# Altium footprint library adafruit.PCBLIB: 648 footprints (part 34 of 41)
Each footprint in its own frame and in the unit in brackets; x right, y up, seen from the top. Pads: shape width x height; smd on the part's side, far side on the other; paste and mask are expansions set on the pad; w line width, h text height; cw(c..) or ccw(c..) is an arc to the next point about the centre after c.
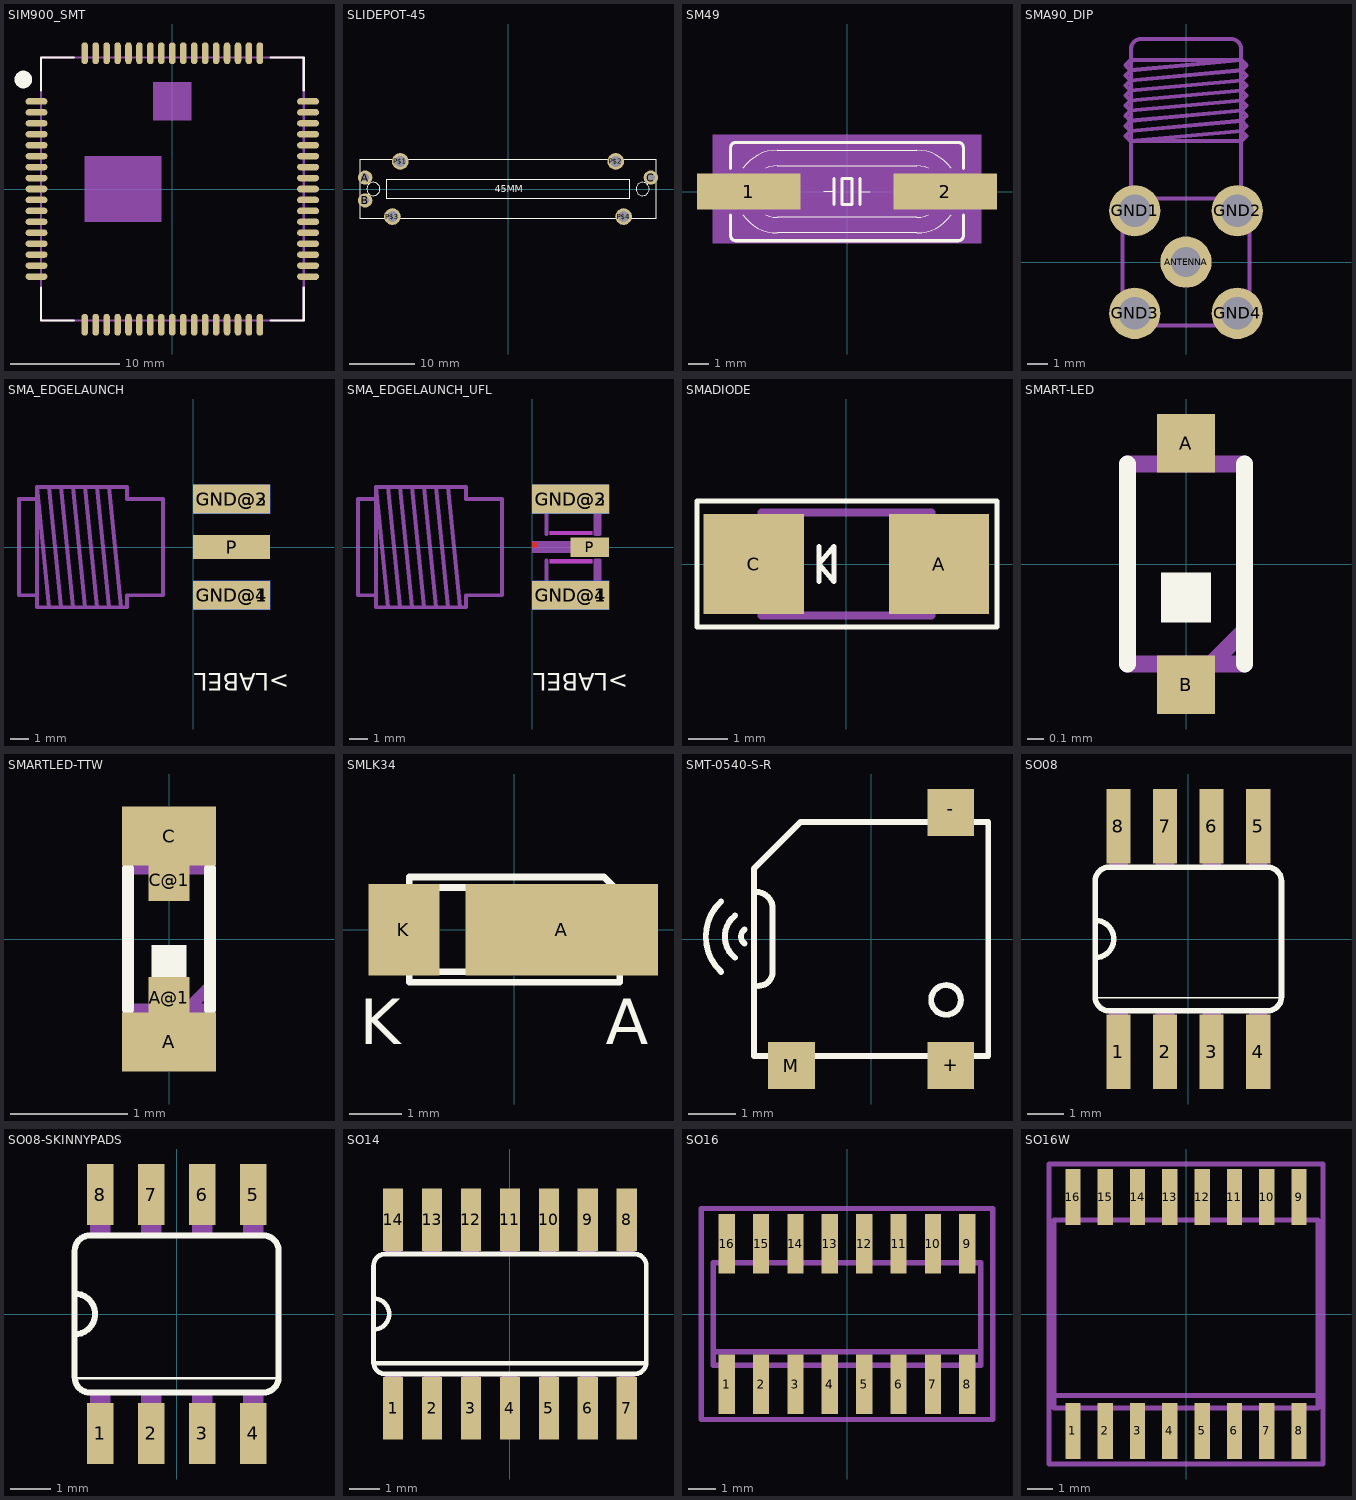
[diagram p33: the footprints below, top view; thin cyan lines are the x and y axes]

## SIM900_SMT [mm]
pads (68):
  rrect100% 2x0.6 smd: P$1(-12.4,8) P$2(-12.4,7) P$3(-12.4,6) P$4(-12.4,5) P$5(-12.4,4) P$6(-12.4,3) P$7(-12.4,2) P$8(-12.4,1) P$9(-12.4,0) P$10(-12.4,-1) P$11(-12.4,-2) P$12(-12.4,-3) P$13(-12.4,-4) P$14(-12.4,-5) P$15(-12.4,-6) P$16(-12.4,-7) P$17(-12.4,-8) P$35(12.4,-8) P$36(12.4,-7) P$37(12.4,-6) P$38(12.4,-5) P$39(12.4,-4) P$40(12.4,-3) P$41(12.4,-2) P$42(12.4,-1) P$43(12.4,0) P$44(12.4,1) P$45(12.4,2) P$46(12.4,3) P$47(12.4,4) P$48(12.4,5) P$49(12.4,6) P$50(12.4,7) P$51(12.4,8)
  rrect100% 0.6x2 smd: P$18(-8,-12.4) P$19(-7,-12.4) P$20(-6,-12.4) P$21(-5,-12.4) P$22(-4,-12.4) P$23(-3,-12.4) P$24(-2,-12.4) P$25(-1,-12.4) P$26(0,-12.4) P$27(1,-12.4) P$28(2,-12.4) P$29(3,-12.4) P$30(4,-12.4) P$31(5,-12.4) P$32(6,-12.4) P$33(7,-12.4) P$34(8,-12.4) P$52(8,12.4) P$53(7,12.4) P$54(6,12.4) P$55(5,12.4) P$56(4,12.4) P$57(3,12.4) P$58(2,12.4) P$59(1,12.4) P$60(0,12.4) P$61(-1,12.4) P$62(-2,12.4) P$63(-3,12.4) P$64(-4,12.4) P$65(-5,12.4) P$66(-6,12.4) P$67(-7,12.4) P$68(-8,12.4)
Top Overlay:
  circle w0.813: c-13.6,10 r0.4
  lines w0.203: -12,-9 -12,-12 -9,-12 ; -12,9 -12,12 -9,12 ; 9,-12 12,-12 12,-9 ; 9,12 12,12 12,9
Mechanical 16:
  lines w0.203: -12,-12 -12,12 12,12 12,-12 -12,-12
Mechanical 27:
  rectangle: -8,-3 -1,3
  rectangle: -1.75,6.25 1.75,9.75

## SLIDEPOT-45 [mil]
pads (7):
  round 86 hole 47.24: A(-856.3,68.9) B(-856.3,-68.9) C(856.3,68.9)
  round 100 hole 66.93: P$1(-645.67,165.35) P$2(645.67,165.35) P$3(-692.91,-165.35) P$4(692.91,-165.35)
Top Overlay:
  circle w5: c-807.09,0 r39.37
  circle w5: c807.09,0 r39.37
  lines w5: -885.83,-177.17 885.83,-177.17 885.83,177.17 -885.83,177.17 -885.83,-177.17 ; -728.35,-59.06 728.35,-59.06 728.35,59.06 -728.35,59.06 -728.35,-59.06
  text "45MM" at -78.74,-19.69 h42.5

## SM49 [mil]
pads (2):
  rect 200x70 smd: 1(-190,0) 2(190,0)
Top Overlay:
  lines w2: -201.15,-45 ccw(c-135,0) -135,-80 135,-80 ccw(c135,0) 201.14,-45 ; -201.15,45 cw(c-135,-0.01) -135,80 135,80 cw(c135,0) 201.15,45 ; -156.8,-45 ccw(c-135,0.01) -135,-50 135,-50 ccw(c135,0.01) 156.8,-45 ; -156.8,45 cw(c-135,-0.01) -135,50 135,50 cw(c135,-0.01) 156.8,45 ; -45,0 -25,0 ; 25,0 45,0
  lines w6: -225,-45 -225,-85 ccw(c-215,-85) -215,-95 215,-95 ccw(c215,-85) 225,-85 225,-45 ; -225,45 -225,85 cw(c-215,85) -215,95 215,95 cw(c215,85) 225,85 225,45 ; -25,-25 -25,0 -25,25 ; 25,-25 25,0 25,25 ; -10,-25 -10,25 10,25 10,-25 -10,-25
Mechanical 10:
  rectangle: -260,-100 260,110
Mechanical 16:
  lines w2: -201.15,-45 cw(c-135,0) -201.15,45 ; -156.8,-45 cw(c-135,0) -156.8,45 ; 156.8,-45 ccw(c135,0) 156.8,45 ; 201.15,-45 ccw(c135,0) 201.15,45
  lines w6: -225,-45 -225,45 ; -225,-15 -255,-15 -255,15 -225,15 ; 225,-45 225,-15 ; 225,45 225,15 ; 225,-15 225,15 ; 225,-15 255,-15 255,15 225,15

## SMA90_DIP [mil]
pads (5):
  round 100 hole 59.06: ANTENNA(0,0)
  round 100 hole 62.99: GND1(-100,100) GND2(100,100) GND3(-100,-100) GND4(100,-100)
Mechanical 16:
  lines w8: -107.28,124.02 -107.28,415.35 ; -107.09,415.94 cw(c-87.99,415.94) -87.99,435.04 ; -87.6,435.04 87.6,435.04 ; 88.19,435.04 cw(c88.19,415.94) 107.28,415.94 ; 107.28,124.02 107.28,415.35 ; -108.27,236.22 -118.11,246.06 -108.27,255.91 ; -108.27,236.22 108.27,255.91 ; -108.27,236.22 108.27,236.22 118.11,246.06 108.27,255.91 ; -108.27,255.91 -118.11,265.75 -108.27,275.59 ; -108.27,255.91 108.27,275.59 ; -108.27,275.59 -118.11,285.43 -108.27,295.28 ; -108.27,275.59 108.27,295.28 ; -108.27,295.28 -118.11,305.12 -108.27,314.96 ; -108.27,295.28 108.27,314.96 ; -108.27,314.96 -118.11,324.8 -108.27,334.65 ; -108.27,314.96 108.27,334.65 ; -108.27,334.65 -118.11,344.49 -108.27,354.33 ; -108.27,334.65 108.27,354.33 ; -108.27,354.33 -118.11,364.17 -108.27,374.02 ; -108.27,354.33 108.27,374.02 ; -108.27,374.02 -118.11,383.86 -108.27,393.7 108.27,393.7 ; -108.27,374.02 108.27,393.7 ; 108.27,255.91 118.11,265.75 108.27,275.59 ; 108.27,275.59 118.11,285.43 108.27,295.28 ; 108.27,295.28 118.11,305.12 108.27,314.96 ; 108.27,314.96 118.11,324.8 108.27,334.65 ; 108.27,334.65 118.11,344.49 108.27,354.33 ; 108.27,354.33 118.11,364.17 108.27,374.02 ; 108.27,374.02 118.11,383.86 108.27,393.7 ; -124.02,-99.21 ccw(c-99.21,-99.21) -99.21,-124.02 99.21,-124.02 ccw(c99.21,-99.21) 124.02,-99.21 124.02,99.21 ccw(c99.21,99.21) 99.21,124.02 -99.21,124.02 ccw(c-99.21,99.21) -124.02,99.21 -124.02,-99.21

## SMA_EDGELAUNCH [mil]
pads (5):
  rect 160x60 smd: GND@1(80,-100) GND@2(80,100)
  rect 160x60 smd far side: GND@3(80,100) GND@4(80,-100)
  rect 160x50 smd: P(80,0)
Top Overlay:
  text ">LABEL" at 200,-250 h62
Mechanical 16:
  rectangle: 0,-12.5 125,12.5
  region: 0,0 10,0 10,10 0,10
  region: 0,0 10,0 10,10 0,10
  lines w8: -150,-125 -175,125 ; -325,-100 -325,-125 -300,-125 ; -325,-100 -362.5,-100 -362.5,100 -325,100 ; -325,-100 -325,100 ; -325,100 -325,125 ; -325,125 -300,125 ; -325,125 -300,-125 ; -300,-125 -275,-125 ; -300,125 -275,125 ; -300,125 -275,-125 ; -275,-125 -250,-125 ; -275,125 -250,125 ; -275,125 -250,-125 ; -250,-125 -225,-125 ; -250,125 -225,125 ; -250,125 -225,-125 ; -225,-125 -200,-125 ; -225,125 -200,125 ; -225,125 -200,-125 ; -200,-125 -175,-125 ; -200,125 -175,125 ; -200,125 -175,-125 ; -175,-125 -137.5,-125 -137.5,-100 -62.5,-100 -62.5,100 -137.5,100 -137.5,125 -175,125

## SMA_EDGELAUNCH_UFL [mil]
pads (5):
  rect 160x60 smd: GND@1(80,-100) GND@2(80,100)
  rect 160x60 smd far side: GND@3(80,100) GND@4(80,-100)
  rect 80x40 smd: P(120,0)
Top Layer:
  region: 0,0 10,0 10,10 0,10
  region: 0,0 10,0 10,10 0,10
Top Overlay:
  text ">LABEL" at 200,-250 h62
Top Paste:
  region: 123,-38.94 39,-38.94 39,-70.94 123,-70.94
  rectangle: 39,38.94 123,70.94
  rectangle: 126,-19 156,19
Top Solder:
  region: 127,-36.94 35,-36.94 35,-72.94 127,-72.94
  rectangle: 35,36.94 127,72.94
Mechanical 8 keep-out:
  rectangle: 36,25 126,34
  rectangle: 36,-34 126,-25
Mechanical 16:
  rectangle: 0,-12.5 125,12.5
  region: 0,0 10,0 10,10 0,10
  region: 0,0 10,0 10,10 0,10
  lines w8: -150,-125 -175,125 ; 29.82,-27.56 29.82,-82.68 132.18,-82.68 ; 29.82,27.56 29.82,82.68 132.18,82.68 ; 136.12,-78.74 136.12,-27.56 ; 136.12,27.56 136.12,78.74 ; -325,-100 -325,100 ; -325,-100 -362.5,-100 -362.5,100 -325,100 ; -325,-100 -325,-125 -300,-125 ; -325,100 -325,125 ; -325,125 -300,-125 ; -325,125 -300,125 ; -300,-125 -275,-125 ; -300,125 -275,-125 ; -300,125 -275,125 ; -275,-125 -250,-125 ; -275,125 -250,-125 ; -275,125 -250,125 ; -250,-125 -225,-125 ; -250,125 -225,-125 ; -250,125 -225,125 ; -225,-125 -200,-125 ; -225,125 -200,-125 ; -225,125 -200,125 ; -200,-125 -175,-125 ; -200,125 -175,-125 ; -200,125 -175,125 ; -175,-125 -137.5,-125 -137.5,-100 -62.5,-100 -62.5,100 -137.5,100 -137.5,125 -175,125 ; 132.18,-82.68 140.06,-82.68 140.06,-27.56 132.18,-27.56 132.18,-82.68 ; 132.18,82.68 140.06,82.68 140.06,27.56 132.18,27.56 132.18,82.68

## SMADIODE [mil]
pads (2):
  rect 100x100 smd: A(92.5,0) C(-92.5,0)
Top Overlay:
  lines w5: -149.17,-54.88 -149.17,-45.12 ; -27.5,-17.5 -27.5,17.5 ; 150.24,52.62 150.24,54.88 ; -149.17,-45.12 -149.17,62.99 150.24,62.99 150.24,54.88 ; -149.17,-45.12 -149.17,-62.99 150.24,-62.99 150.24,54.88 ; -27.5,0 -12.5,17.5 -12.5,-17.5 -27.5,0
Mechanical 16:
  rectangle: -111.22,-43.31 -85.63,43.31
  region: 111.22,43.31 85.63,43.31 85.63,-43.31 111.22,-43.31
  rectangle: -68.9,-48.23 -42.32,48.23
  lines w8: -84.65,-51.18 84.65,-51.18 84.65,51.18 -84.65,51.18 -84.65,-51.18

## SMART-LED [mm]
pads (2):
  rect 0.35x0.35 smd: A(0,0.725) B(0,-0.725)
Top Overlay:
  rectangle: -0.15,-0.35 0.15,-0.05
  lines w0.102: -0.35,-0.6 -0.35,0.6 ; 0.35,-0.6 0.35,0.6
Mechanical 16:
  rectangle: -0.15,0.6 0.15,0.85
  rectangle: -0.15,-0.85 0.15,-0.6
  lines w0.102: -0.35,-0.6 0.35,-0.6 ; -0.35,0.6 0.35,0.6 ; 0.15,-0.6 0.35,-0.4

## SMARTLED-TTW [mm]
pads (4):
  rect 0.8x0.5 smd: A(0,-0.875) C(0,0.875)
  rect 0.35x0.35 smd: A@1(0,-0.5) C@1(0,0.5)
Top Overlay:
  rectangle: -0.15,-0.35 0.15,-0.05
  lines w0.102: -0.35,-0.6 -0.35,0.6 ; 0.35,-0.6 0.35,0.6
Top Paste:
  rectangle: -0.225,0.3 0.225,0.975
  region: 0.225,-0.3 -0.225,-0.3 -0.225,-0.975 0.225,-0.975
Top Solder:
  rectangle: -0.175,0.325 0.175,0.7
  region: 0.175,-0.325 -0.175,-0.325 -0.175,-0.7 0.175,-0.7
Mechanical 16:
  rectangle: -0.15,0.6 0.15,0.85
  rectangle: -0.15,-0.85 0.15,-0.6
  lines w0.102: -0.35,-0.6 0.35,-0.6 ; -0.35,0.6 0.35,0.6 ; 0.15,-0.6 0.35,-0.4

## SMLK34 [mil]
pads (2):
  rect 143.7x68.5 smd: A(35.43,0)
  rect 53.15x68.5 smd: K(-82.68,0)
Top Overlay:
  lines w5: -78.74,-39.37 78.74,-39.37 78.74,27.56 66.93,39.37 -78.74,39.37 -78.74,-39.37 ; -70.87,-31.5 -70.87,31.5 62.99,31.5 70.87,23.62 70.87,-31.5 -70.87,-31.5
  text "A" at 68.11,-85.75 h34
  text "K" at -115.67,-85.75 h34

## SMT-0540-S-R [mm]
pads (3):
  rect 1x1 smd: +(1.7,-2.7) -(1.7,2.7) M(-1.7,-2.7)
Top Overlay:
  circle w0.127: c1.6,-1.3 r0.316
  lines w0.127: -3.2,-0.7 cw(c-2.5,0.05) -3.2,0.8 ; -2.9,-0.4 cw(c-2.55,0.05) -2.9,0.5 ; -2.7,-0.1 cw(c-2.588,0.05) -2.7,0.2 ; -2.4,-1 ccw(c-2.4,-0.7) -2.1,-0.7 -2.1,0.7 ccw(c-2.45,0.65) -2.5,1 ; -2.5,1 -2.5,-2.5 2.5,-2.5 2.5,2.5 -1.5,2.5 -2.5,1.5 -2.5,1

## SO08 [mil]
pads (8):
  rect 26x80 smd: 1(-75,-121) 2(-25,-121) 3(25,-121) 4(75,-121) 5(75,121) 6(25,121) 7(-25,121) 8(-75,121)
Top Overlay:
  lines w2: -100,-63 100,-63
  lines w6: -100,-20 ccw(c-100,0) -100,20 ; -100,-62 ccw(c-85,-62) -85,-77 85,-77 ccw(c85,-62) 100,-62 100,62 ccw(c85,62) 85,77 -85,77 ccw(c-85,62) -100,62 -100,-62
Mechanical 16:
  rectangle: -85,77 -65,122
  rectangle: -35,77 -15,122
  rectangle: 15,77 35,122
  rectangle: 65,-122 85,-77
  rectangle: 15,-121 35,-76
  rectangle: -35,-122 -15,-77
  rectangle: -85,-122 -65,-77
  rectangle: 65,77 85,122

## SO08-SKINNYPADS [mil]
pads (8):
  rect 26x60 smd: 1(-75,-117.06) 2(-25,-117.06) 3(25,-117.06) 4(75,-117.06) 5(75,117.06) 6(25,117.06) 7(-25,117.06) 8(-75,117.06)
Top Overlay:
  lines w2: -100,-63 100,-63
  lines w6: -100,-20 ccw(c-100,0) -100,20 ; -100,-62 ccw(c-85,-62) -85,-77 85,-77 ccw(c85,-62) 100,-62 100,62 ccw(c85,62) 85,77 -85,77 ccw(c-85,62) -100,62 -100,-62
Mechanical 16:
  rectangle: -85,77 -65,122
  rectangle: -35,77 -15,122
  rectangle: 15,77 35,122
  rectangle: 65,-122 85,-77
  rectangle: 15,-121 35,-76
  rectangle: -35,-122 -15,-77
  rectangle: -85,-122 -65,-77
  rectangle: 65,77 85,122

## SO14 [mil]
pads (14):
  rect 26x80 smd: 1(-150,-121) 2(-100,-121) 3(-50,-121) 4(0,-121) 5(50,-121) 6(100,-121) 7(150,-121) 8(150,121) 9(100,121) 10(50,121) 11(0,121) 12(-50,121) 13(-100,121) 14(-150,121)
Top Overlay:
  lines w6: -175,-63 175,-63 ; -175,-20 ccw(c-175,0) -175,20 ; -175,-20 -175,-62 ccw(c-160,-62) -160,-77 160,-77 ccw(c160,-62) 175,-62 175,62 ccw(c160,62) 160,77 -160,77 ccw(c-160,62) -175,62 -175,20 ; -175,-20 -175,20
Mechanical 16:
  rectangle: 140,-122 160,-77
  rectangle: 90,-122 110,-77
  rectangle: 40,-122 60,-77
  rectangle: 140,77 160,122
  rectangle: 90,77 110,122
  rectangle: 40,77 60,122
  rectangle: -160,77 -140,122
  rectangle: -110,77 -90,122
  rectangle: -60,77 -40,122
  rectangle: -10,-122 10,-77
  rectangle: -60,-121 -40,-76
  rectangle: -110,-122 -90,-77
  rectangle: -160,-122 -140,-77
  rectangle: -10,77 10,122

## SO16 [mil]
pads (16):
  rect 23.62x86.61 smd: 1(-175,-102.36) 2(-125,-102.36) 3(-75,-102.36) 4(-25,-102.36) 5(25,-102.36) 6(75,-102.36) 7(125,-102.36) 8(175,-102.36) 9(175,102.36) 10(125,102.36) 11(75,102.36) 12(25,102.36) 13(-25,102.36) 14(-75,102.36) 15(-125,102.36) 16(-175,102.36)
Mechanical 16:
  rectangle: -184.65,-122.05 -165.35,-78.74
  rectangle: -134.65,-122.05 -115.35,-78.74
  rectangle: -84.65,-122.05 -65.35,-78.74
  rectangle: -34.65,-122.05 -15.35,-78.74
  rectangle: 65.35,78.74 84.65,122.05
  rectangle: 15.35,78.74 34.65,122.05
  rectangle: -34.65,78.74 -15.35,122.05
  rectangle: -84.65,78.74 -65.35,122.05
  rectangle: 15.35,-122.05 34.65,-78.74
  rectangle: 65.35,-122.05 84.65,-78.74
  rectangle: 115.35,-122.05 134.65,-78.74
  rectangle: 165.35,-122.05 184.65,-78.74
  rectangle: 165.35,78.74 184.65,122.05
  rectangle: 115.35,78.74 134.65,122.05
  rectangle: -134.65,78.74 -115.35,122.05
  rectangle: -184.65,78.74 -165.35,122.05
  lines w8: -194.49,-55.12 -194.49,-74.8 194.49,-74.8 194.49,-55.12 ; -194.49,-55.12 -194.49,74.8 194.49,74.8 194.49,-55.12 ; -194.49,-55.12 194.49,-55.12
Mechanical 27:
  lines w7.87: -212.4,-153.54 212.4,-153.54 212.4,153.54 -212.4,153.54 -212.4,-153.54

## SO16W [mil]
pads (16):
  rect 23.62x86.61 smd: 1(-175,-181.1) 2(-125,-181.1) 3(-75,-181.1) 4(-25,-181.1) 5(25,-181.1) 6(75,-181.1) 7(125,-181.1) 8(175,-181.1) 9(175,181.1) 10(125,181.1) 11(75,181.1) 12(25,181.1) 13(-25,181.1) 14(-75,181.1) 15(-125,181.1) 16(-175,181.1)
Mechanical 16:
  rectangle: -184.65,149.61 -165.35,209.45
  rectangle: -134.65,149.61 -115.35,209.45
  rectangle: -84.65,149.61 -65.35,209.45
  rectangle: -34.65,149.61 -15.35,209.45
  rectangle: 15.35,149.61 34.65,209.45
  rectangle: 65.35,149.61 84.65,209.45
  rectangle: 115.35,149.61 134.65,209.45
  rectangle: 165.35,149.61 184.65,209.45
  rectangle: 165.35,-209.45 184.65,-149.61
  rectangle: 115.35,-209.45 134.65,-149.61
  rectangle: 65.35,-209.45 84.65,-149.61
  rectangle: 15.35,-209.45 34.65,-149.61
  rectangle: -34.65,-209.45 -15.35,-149.61
  rectangle: -84.65,-209.45 -65.35,-149.61
  rectangle: -134.65,-209.45 -115.35,-149.61
  rectangle: -184.65,-209.45 -165.35,-149.61
  lines w8: -204.33,-125.98 204.33,-125.98 ; -204.33,-125.98 -204.33,145.67 204.33,145.67 204.33,-125.98 ; -204.33,-125.98 -204.33,-145.67 204.33,-145.67 204.33,-125.98
Mechanical 27:
  lines w7.87: -212.4,-232.28 -212.4,232.28 212.4,232.28 212.4,-232.28 -212.4,-232.28